# Altium integrated library Self made library.IntLib: 370 symbols (part 1 of 3)
Pins are listed as number, name and electrical type; pins without a type are passive.

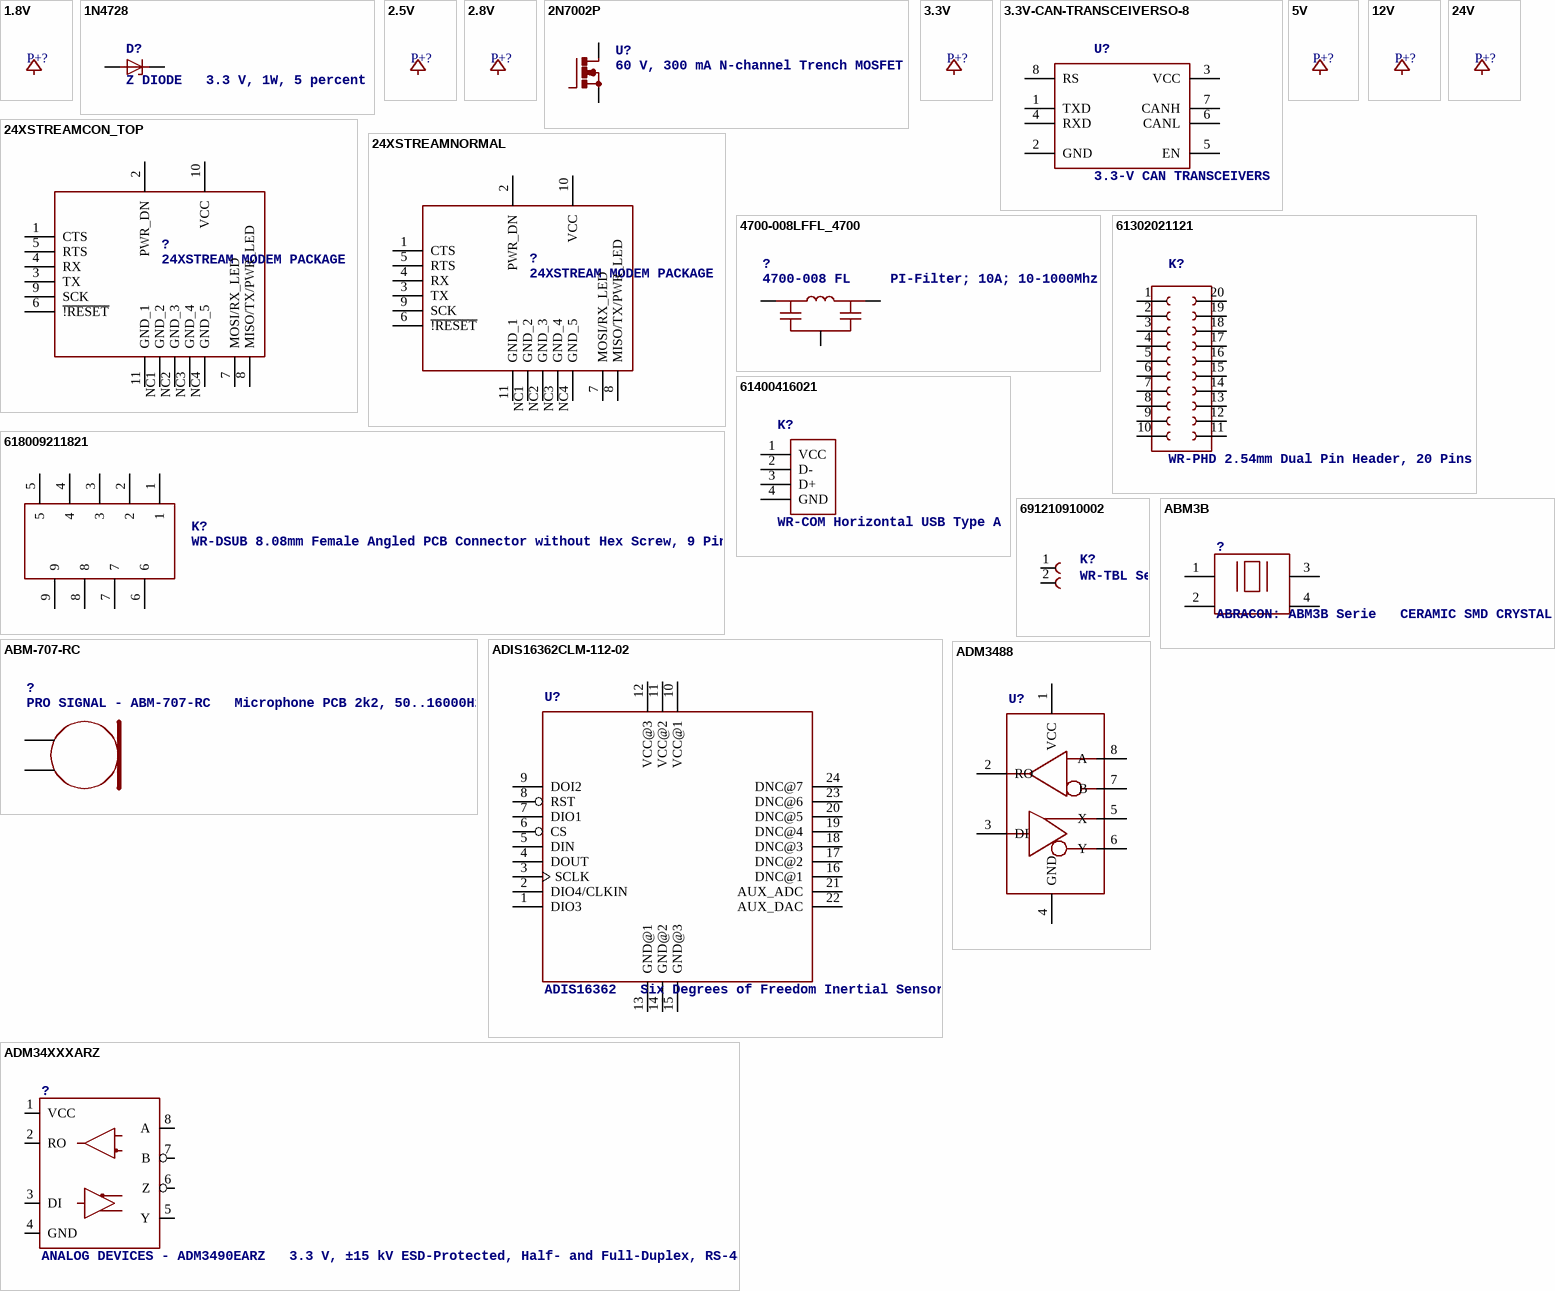
[diagram p0: symbols 1.8V to ADM3488]

## 1.8V
designator P+?
pins: ?1 1.8V (oe)

## 1N4728
designator D?, comment Z DIODE   3.3 V, 1W, 5 percent
footprint DO41Z10
pins: A, C

## 2.5V
designator P+?
pins: ?1 2.5V (oe)

## 2.8V
designator P+?
pins: ?1 2.8V (oe)

## 2N7002P
designator U?, comment 60 V, 300 mA N-channel Trench MOSFET
MANUFACTURER: NXP Semiconductors; MANUFACTURER_PART_NUMBER: 2N7002,215; UNIT_PRICE: 0.147; SUPPLIER: mouser; SUPPLIER_PART_NUMBER: 771-2N7002-T/R
footprint TO236
pins: 1 G, 2 S, 3 D

## 3.3V
designator P+?
pins: ?1 3.3V (oe)

## 3.3V-CAN-TRANSCEIVERSO-8
designator U?, comment 3.3-V CAN TRANSCEIVERS
footprint SO-8
pins: 1 TXD, 2 GND, 3 VCC, 4 RXD, 5 EN, 6 CANL, 7 CANH, 8 RS

## 5V
designator P+?
pins: ?1 5V (oe)

## 12V
designator P+?
pins: ?1 12V (oe)

## 24V
designator P+?
pins: ?1 24V (oe)

## 24XSTREAMCON_TOP
designator ?, comment 24XSTREAM MODEM PACKAGE
footprint 24XSTREAM_CON_TOP_RIGHT_ANGLE
pins: 1 CTS, 2 PWR_DN, 3 TX, 4 RX, 5 RTS, 6 ~{!RESET}, 7 MOSI/RX_LED, 8 MISO/TX/PWR_LED, 9 SCK, 10 VCC (power), 11 GND_1 (power), NC1 GND_2 (power), NC2 GND_3 (power), NC3 GND_4 (power), NC4 GND_5 (power)

## 24XSTREAMNORMAL
designator ?, comment 24XSTREAM MODEM PACKAGE
footprint 24XSTREAM
pins: 1 CTS, 2 PWR_DN, 3 TX, 4 RX, 5 RTS, 6 ~{!RESET}, 7 MOSI/RX_LED, 8 MISO/TX/PWR_LED, 9 SCK, 10 VCC (power), 11 GND_1 (power), NC1 GND_2 (power), NC2 GND_3 (power), NC3 GND_4 (power), NC4 GND_5 (power)

## 4700-008LFFL_4700
designator ?, comment 4700-008 FL     PI-Filter; 10A; 10-1000Mhz
footprint FL_4700
pins: 1, 2 3, G 2

## 61302021121
designator K?, comment WR-PHD 2.54mm Dual Pin Header, 20 Pins
MANUFACTURER: Würth; MANUFACTURER_PART_NUMBER: 613 020 211 21; SUPPLIER: Würth; SUPPLIER_PART_NUMBER: 613 020 211 21
footprint 61302021121
pins: 1, 2, 3, 4, 5, 6, 7, 8, 9, 10, 11, 12, 13, 14, 15, 16, 17, 18, 19, 20

## 61400416021
designator K?, comment WR-COM Horizontal USB Type A
MANUFACTURER: Würth; MANUFACTURER_PART_NUMBER: 614 004 160 21; SUPPLIER: Würth; SUPPLIER_PART_NUMBER: 614 004 160 21
footprint 61400416021
pins: 1 VCC, 2 D-, 3 D+, 4 GND

## 618009211821
designator K?, comment WR-DSUB 8.08mm Female Angled PCB Connector without Hex Screw, 9 Pins
MANUFACTURER: Würth; MANUFACTURER_PART_NUMBER: 618 009 211 821; SUPPLIER: Würth; SUPPLIER_PART_NUMBER: 618 009 211 821
footprint 618009211821
pins: 1, 2, 3, 4, 5, 6, 7, 8, 9

## 691210910002
designator K?, comment WR-TBL Serie 2109 - 2.54mm Horizontal Entry Modular with Rising Cage Clamp - 0.8mm2 Wires, 2 Pins
MANUFACTURER: Würth; MANUFACTURER_PART_NUMBER: 691 210 910 002; SUPPLIER: Würth; SUPPLIER_PART_NUMBER: 691 210 910 002
footprint 691210910002
pins: 1, 2

## ABM3B
designator ?, comment ABRACON: ABM3B Serie   CERAMIC SMD CRYSTAL
footprint ABM3B
pins: 1, 2, 3 4, 4 3

## ABM-707-RC
designator ?, comment PRO SIGNAL - ABM-707-RC   Microphone PCB 2k2, 50..16000Hz
footprint ABM-707-RC
pins: 1, 2

## ADIS16362CLM-112-02
designator U?, comment ADIS16362   Six Degrees of Freedom Inertial Sensor
footprint SAMTEC-112-02-BE
pins: 1 DIO3, 2 DIO4/CLKIN, 3 SCLK, 4 DOUT, 5 DIN, 6 CS, 7 DIO1, 8 RST, 9 DOI2, 10 VCC@1, 11 VCC@2, 12 VCC@3, 13 GND@1, 14 GND@2, 15 GND@3, 16 DNC@1, 17 DNC@2, 18 DNC@3, 19 DNC@4, 20 DNC@5, 21 AUX_ADC, 22 AUX_DAC, 23 DNC@6, 24 DNC@7

## ADM34XXXARZ
designator ?, comment ANALOG DEVICES - ADM3490EARZ   3.3 V, ±15 kV ESD-Protected, Half- and Full-Duplex, RS-485/RS-422 Transceivers   Same footprint and same fonction but other ESD and/or speed specification (see datascheet) : ADM3488EARZ, ADM3488ARZ, ADM3490ARZ
footprint SOIC8
pins: 1 VCC, 2 RO, 3 DI, 4 GND, 5 Y, 6 Z, 7 B, 8 A

## ADM3488
designator U?
footprint AD_SOIC_8
pins: 1 VCC (power), 2 RO, 3 DI, 4 GND (power), 5 X, 6 Y, 7 B, 8 A

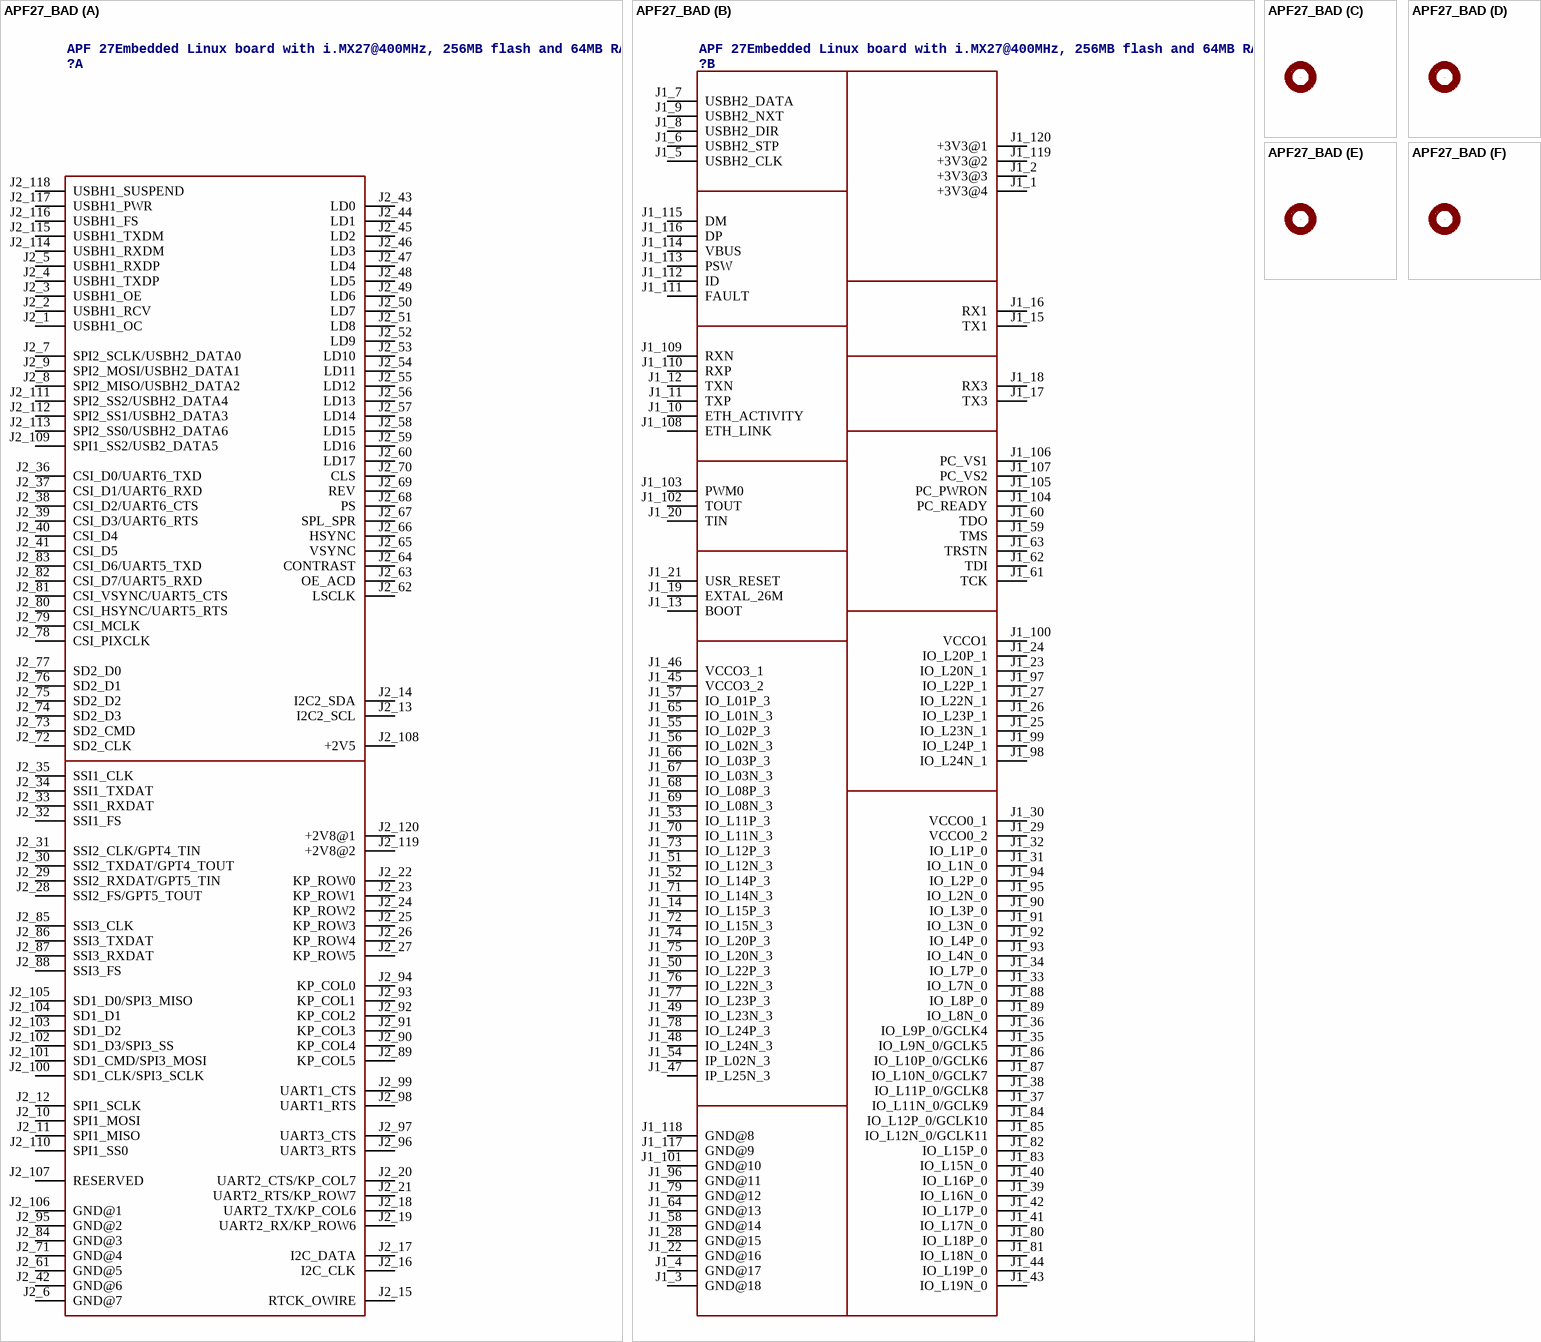
[diagram p1: symbol APF27_BAD]

## APF27_BAD
designator ?, comment APF 27Embedded Linux board with i.MX27@400MHz, 256MB flash and 64MB RAM
footprint APF27_WRONG_VERSION_DO_NOT_USE
part A pins: J2_1 USBH1_OC, J2_2 USBH1_RCV, J2_3 USBH1_OE, J2_4 USBH1_TXDP, J2_5 USBH1_RXDP, J2_6 GND@7, J2_7 SPI2_SCLK/USBH2_DATA0, J2_8 SPI2_MISO/USBH2_DATA2, J2_9 SPI2_MOSI/USBH2_DATA1, J2_10 SPI1_MOSI, J2_11 SPI1_MISO, J2_12 SPI1_SCLK, J2_13 I2C2_SCL, J2_14 I2C2_SDA, J2_15 RTCK_OWIRE, J2_16 I2C_CLK, J2_17 I2C_DATA, J2_18 UART2_TX/KP_COL6, J2_19 UART2_RX/KP_ROW6, J2_20 UART2_CTS/KP_COL7, J2_21 UART2_RTS/KP_ROW7, J2_22 KP_ROW0, J2_23 KP_ROW1, J2_24 KP_ROW2, J2_25 KP_ROW3, J2_26 KP_ROW4, J2_27 KP_ROW5, J2_28 SSI2_FS/GPT5_TOUT, J2_29 SSI2_RXDAT/GPT5_TIN, J2_30 SSI2_TXDAT/GPT4_TOUT, J2_31 SSI2_CLK/GPT4_TIN, J2_32 SSI1_FS, J2_33 SSI1_RXDAT, J2_34 SSI1_TXDAT, J2_35 SSI1_CLK, J2_36 CSI_D0/UART6_TXD, J2_37 CSI_D1/UART6_RXD, J2_38 CSI_D2/UART6_CTS, J2_39 CSI_D3/UART6_RTS, J2_40 CSI_D4, J2_41 CSI_D5, J2_42 GND@6, J2_43 LD0, J2_44 LD1, J2_45 LD2, J2_46 LD3, J2_47 LD4, J2_48 LD5, J2_49 LD6, J2_50 LD7, J2_51 LD8, J2_52 LD9, J2_53 LD10, J2_54 LD11, J2_55 LD12, J2_56 LD13, J2_57 LD14, J2_58 LD15, J2_59 LD16, J2_60 LD17, J2_61 GND@5, J2_62 LSCLK, J2_63 OE_ACD, J2_64 CONTRAST, J2_65 VSYNC, J2_66 HSYNC, J2_67 SPL_SPR, J2_68 PS, J2_69 REV, J2_70 CLS, J2_71 GND@4, J2_72 SD2_CLK, J2_73 SD2_CMD, J2_74 SD2_D3, J2_75 SD2_D2, J2_76 SD2_D1, J2_77 SD2_D0, J2_78 CSI_PIXCLK, J2_79 CSI_MCLK, J2_80 CSI_HSYNC/UART5_RTS, J2_81 CSI_VSYNC/UART5_CTS, J2_82 CSI_D7/UART5_RXD, J2_83 CSI_D6/UART5_TXD, J2_84 GND@3, J2_85 SSI3_CLK, J2_86 SSI3_TXDAT, J2_87 SSI3_RXDAT, J2_88 SSI3_FS, J2_89 KP_COL5, J2_90 KP_COL4, J2_91 KP_COL3, J2_92 KP_COL2, J2_93 KP_COL1, J2_94 KP_COL0, J2_95 GND@2, J2_96 UART3_RTS, J2_97 UART3_CTS, J2_98 UART1_RTS, J2_99 UART1_CTS, J2_100 SD1_CLK/SPI3_SCLK, J2_101 SD1_CMD/SPI3_MOSI, J2_102 SD1_D3/SPI3_SS, J2_103 SD1_D2, J2_104 SD1_D1, J2_105 SD1_D0/SPI3_MISO, J2_106 GND@1, J2_107 RESERVED, J2_108 +2V5, J2_109 SPI1_SS2/USB2_DATA5, J2_110 SPI1_SS0, J2_111 SPI2_SS2/USBH2_DATA4, J2_112 SPI2_SS1/USBH2_DATA3, J2_113 SPI2_SS0/USBH2_DATA6, J2_114 USBH1_RXDM, J2_115 USBH1_TXDM, J2_116 USBH1_FS, J2_117 USBH1_PWR, J2_118 USBH1_SUSPEND, J2_119 +2V8@2, J2_120 +2V8@1
part B pins: J1_1 +3V3@4, J1_2 +3V3@3, J1_3 GND@18, J1_4 GND@17, J1_5 USBH2_CLK, J1_6 USBH2_STP, J1_7 USBH2_DATA, J1_8 USBH2_DIR, J1_9 USBH2_NXT, J1_10 ETH_ACTIVITY, J1_11 TXP, J1_12 TXN, J1_13 BOOT, J1_14 IO_L15P_3, J1_15 TX1, J1_16 RX1, J1_17 TX3, J1_18 RX3, J1_19 EXTAL_26M, J1_20 TIN, J1_21 USR_RESET, J1_22 GND@16, J1_23 IO_L20N_1, J1_24 IO_L20P_1, J1_25 IO_L23N_1, J1_26 IO_L23P_1, J1_27 IO_L22N_1, J1_28 GND@15, J1_29 VCCO0_2, J1_30 VCCO0_1, J1_31 IO_L1N_0, J1_32 IO_L1P_0, J1_33 IO_L7N_0, J1_34 IO_L7P_0, J1_35 IO_L9N_0/GCLK5, J1_36 IO_L9P_0/GCLK4, J1_37 IO_L11N_0/GCLK9, J1_38 IO_L11P_0/GCLK8, J1_39 IO_L16N_0, J1_40 IO_L16P_0, J1_41 IO_L17N_0, J1_42 IO_L17P_0, J1_43 IO_L19N_0, J1_44 IO_L19P_0, J1_45 VCCO3_2, J1_46 VCCO3_1, J1_47 IP_L25N_3, J1_48 IO_L24N_3, J1_49 IO_L23N_3, J1_50 IO_L22P_3, J1_51 IO_L12N_3, J1_52 IO_L14P_3, J1_53 IO_L11P_3, J1_54 IP_L02N_3, J1_55 IO_L02P_3, J1_56 IO_L02N_3, J1_57 IO_L01P_3, J1_58 GND@14, J1_59 TMS, J1_60 TDO, J1_61 TCK, J1_62 TDI, J1_63 TRSTN, J1_64 GND@13, J1_65 IO_L01N_3, J1_66 IO_L03P_3, J1_67 IO_L03N_3, J1_68 IO_L08P_3, J1_69 IO_L08N_3, J1_70 IO_L11N_3, J1_71 IO_L14N_3, J1_72 IO_L15N_3, J1_73 IO_L12P_3, J1_74 IO_L20P_3, J1_75 IO_L20N_3, J1_76 IO_L22N_3, J1_77 IO_L23P_3, J1_78 IO_L24P_3, J1_79 GND@12, J1_80 IO_L18P_0, J1_81 IO_L18N_0, J1_82 IO_L15P_0, J1_83 IO_L15N_0, J1_84 IO_L12P_0/GCLK10, J1_85 IO_L12N_0/GCLK11, J1_86 IO_L10P_0/GCLK6, J1_87 IO_L10N_0/GCLK7, J1_88 IO_L8P_0, J1_89 IO_L8N_0, J1_90 IO_L3P_0, J1_91 IO_L3N_0, J1_92 IO_L4P_0, J1_93 IO_L4N_0, J1_94 IO_L2P_0, J1_95 IO_L2N_0, J1_96 GND@11, J1_97 IO_L22P_1, J1_98 IO_L24N_1, J1_99 IO_L24P_1, J1_100 VCCO1, J1_101 GND@10, J1_102 TOUT, J1_103 PWM0, J1_104 PC_READY, J1_105 PC_PWRON, J1_106 PC_VS1, J1_107 PC_VS2, J1_108 ETH_LINK, J1_109 RXN, J1_110 RXP, J1_111 FAULT, J1_112 ID, J1_113 PSW, J1_114 VBUS, J1_115 DM, J1_116 DP, J1_117 GND@9, J1_118 GND@8, J1_119 +3V3@2, J1_120 +3V3@1
part C pins: MH_1 MH
part D pins: MH_2 MH
part E pins: MH_3 MH
part F pins: MH_4 MH

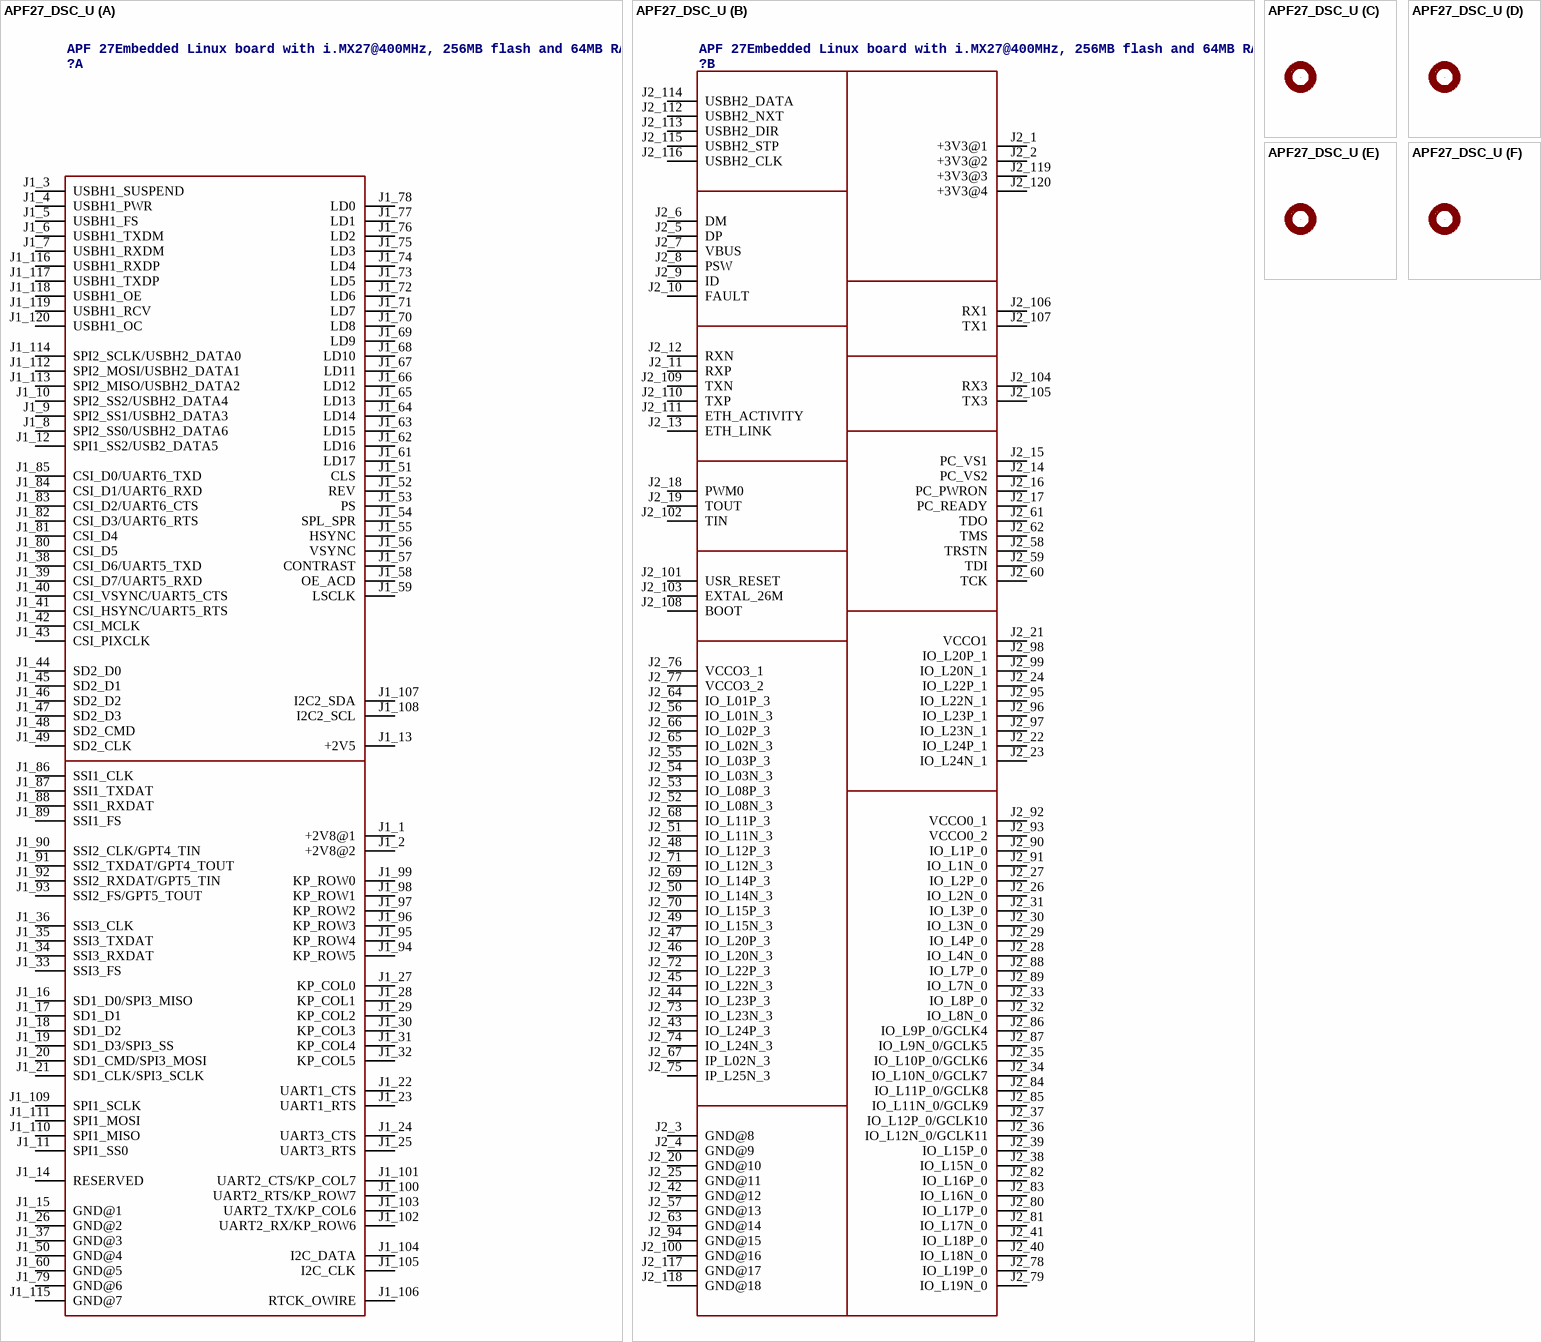
[diagram p2: symbol APF27_DSC_U]

## APF27_DSC_U
designator ?, comment APF 27Embedded Linux board with i.MX27@400MHz, 256MB flash and 64MB RAM
footprint AFP27_DESERIALIZER_UNDER_CONN
part A pins: J1_1 +2V8@1, J1_2 +2V8@2, J1_3 USBH1_SUSPEND, J1_4 USBH1_PWR, J1_5 USBH1_FS, J1_6 USBH1_TXDM, J1_7 USBH1_RXDM, J1_8 SPI2_SS0/USBH2_DATA6, J1_9 SPI2_SS1/USBH2_DATA3, J1_10 SPI2_SS2/USBH2_DATA4, J1_11 SPI1_SS0, J1_12 SPI1_SS2/USB2_DATA5, J1_13 +2V5, J1_14 RESERVED, J1_15 GND@1, J1_16 SD1_D0/SPI3_MISO, J1_17 SD1_D1, J1_18 SD1_D2, J1_19 SD1_D3/SPI3_SS, J1_20 SD1_CMD/SPI3_MOSI, J1_21 SD1_CLK/SPI3_SCLK, J1_22 UART1_CTS, J1_23 UART1_RTS, J1_24 UART3_CTS, J1_25 UART3_RTS, J1_26 GND@2, J1_27 KP_COL0, J1_28 KP_COL1, J1_29 KP_COL2, J1_30 KP_COL3, J1_31 KP_COL4, J1_32 KP_COL5, J1_33 SSI3_FS, J1_34 SSI3_RXDAT, J1_35 SSI3_TXDAT, J1_36 SSI3_CLK, J1_37 GND@3, J1_38 CSI_D6/UART5_TXD, J1_39 CSI_D7/UART5_RXD, J1_40 CSI_VSYNC/UART5_CTS, J1_41 CSI_HSYNC/UART5_RTS, J1_42 CSI_MCLK, J1_43 CSI_PIXCLK, J1_44 SD2_D0, J1_45 SD2_D1, J1_46 SD2_D2, J1_47 SD2_D3, J1_48 SD2_CMD, J1_49 SD2_CLK, J1_50 GND@4, J1_51 CLS, J1_52 REV, J1_53 PS, J1_54 SPL_SPR, J1_55 HSYNC, J1_56 VSYNC, J1_57 CONTRAST, J1_58 OE_ACD, J1_59 LSCLK, J1_60 GND@5, J1_61 LD17, J1_62 LD16, J1_63 LD15, J1_64 LD14, J1_65 LD13, J1_66 LD12, J1_67 LD11, J1_68 LD10, J1_69 LD9, J1_70 LD8, J1_71 LD7, J1_72 LD6, J1_73 LD5, J1_74 LD4, J1_75 LD3, J1_76 LD2, J1_77 LD1, J1_78 LD0, J1_79 GND@6, J1_80 CSI_D5, J1_81 CSI_D4, J1_82 CSI_D3/UART6_RTS, J1_83 CSI_D2/UART6_CTS, J1_84 CSI_D1/UART6_RXD, J1_85 CSI_D0/UART6_TXD, J1_86 SSI1_CLK, J1_87 SSI1_TXDAT, J1_88 SSI1_RXDAT, J1_89 SSI1_FS, J1_90 SSI2_CLK/GPT4_TIN, J1_91 SSI2_TXDAT/GPT4_TOUT, J1_92 SSI2_RXDAT/GPT5_TIN, J1_93 SSI2_FS/GPT5_TOUT, J1_94 KP_ROW5, J1_95 KP_ROW4, J1_96 KP_ROW3, J1_97 KP_ROW2, J1_98 KP_ROW1, J1_99 KP_ROW0, J1_100 UART2_RTS/KP_ROW7, J1_101 UART2_CTS/KP_COL7, J1_102 UART2_RX/KP_ROW6, J1_103 UART2_TX/KP_COL6, J1_104 I2C_DATA, J1_105 I2C_CLK, J1_106 RTCK_OWIRE, J1_107 I2C2_SDA, J1_108 I2C2_SCL, J1_109 SPI1_SCLK, J1_110 SPI1_MISO, J1_111 SPI1_MOSI, J1_112 SPI2_MOSI/USBH2_DATA1, J1_113 SPI2_MISO/USBH2_DATA2, J1_114 SPI2_SCLK/USBH2_DATA0, J1_115 GND@7, J1_116 USBH1_RXDP, J1_117 USBH1_TXDP, J1_118 USBH1_OE, J1_119 USBH1_RCV, J1_120 USBH1_OC
part B pins: J2_1 +3V3@1, J2_2 +3V3@2, J2_3 GND@8, J2_4 GND@9, J2_5 DP, J2_6 DM, J2_7 VBUS, J2_8 PSW, J2_9 ID, J2_10 FAULT, J2_11 RXP, J2_12 RXN, J2_13 ETH_LINK, J2_14 PC_VS2, J2_15 PC_VS1, J2_16 PC_PWRON, J2_17 PC_READY, J2_18 PWM0, J2_19 TOUT, J2_20 GND@10, J2_21 VCCO1, J2_22 IO_L24P_1, J2_23 IO_L24N_1, J2_24 IO_L22P_1, J2_25 GND@11, J2_26 IO_L2N_0, J2_27 IO_L2P_0, J2_28 IO_L4N_0, J2_29 IO_L4P_0, J2_30 IO_L3N_0, J2_31 IO_L3P_0, J2_32 IO_L8N_0, J2_33 IO_L8P_0, J2_34 IO_L10N_0/GCLK7, J2_35 IO_L10P_0/GCLK6, J2_36 IO_L12N_0/GCLK11, J2_37 IO_L12P_0/GCLK10, J2_38 IO_L15N_0, J2_39 IO_L15P_0, J2_40 IO_L18N_0, J2_41 IO_L18P_0, J2_42 GND@12, J2_43 IO_L24P_3, J2_44 IO_L23P_3, J2_45 IO_L22N_3, J2_46 IO_L20N_3, J2_47 IO_L20P_3, J2_48 IO_L12P_3, J2_49 IO_L15N_3, J2_50 IO_L14N_3, J2_51 IO_L11N_3, J2_52 IO_L08N_3, J2_53 IO_L08P_3, J2_54 IO_L03N_3, J2_55 IO_L03P_3, J2_56 IO_L01N_3, J2_57 GND@13, J2_58 TRSTN, J2_59 TDI, J2_60 TCK, J2_61 TDO, J2_62 TMS, J2_63 GND@14, J2_64 IO_L01P_3, J2_65 IO_L02N_3, J2_66 IO_L02P_3, J2_67 IP_L02N_3, J2_68 IO_L11P_3, J2_69 IO_L14P_3, J2_70 IO_L15P_3, J2_71 IO_L12N_3, J2_72 IO_L22P_3, J2_73 IO_L23N_3, J2_74 IO_L24N_3, J2_75 IP_L25N_3, J2_76 VCCO3_1, J2_77 VCCO3_2, J2_78 IO_L19P_0, J2_79 IO_L19N_0, J2_80 IO_L17P_0, J2_81 IO_L17N_0, J2_82 IO_L16P_0, J2_83 IO_L16N_0, J2_84 IO_L11P_0/GCLK8, J2_85 IO_L11N_0/GCLK9, J2_86 IO_L9P_0/GCLK4, J2_87 IO_L9N_0/GCLK5, J2_88 IO_L7P_0, J2_89 IO_L7N_0, J2_90 IO_L1P_0, J2_91 IO_L1N_0, J2_92 VCCO0_1, J2_93 VCCO0_2, J2_94 GND@15, J2_95 IO_L22N_1, J2_96 IO_L23P_1, J2_97 IO_L23N_1, J2_98 IO_L20P_1, J2_99 IO_L20N_1, J2_100 GND@16, J2_101 USR_RESET, J2_102 TIN, J2_103 EXTAL_26M, J2_104 RX3, J2_105 TX3, J2_106 RX1, J2_107 TX1, J2_108 BOOT, J2_109 TXN, J2_110 TXP, J2_111 ETH_ACTIVITY, J2_112 USBH2_NXT, J2_113 USBH2_DIR, J2_114 USBH2_DATA, J2_115 USBH2_STP, J2_116 USBH2_CLK, J2_117 GND@17, J2_118 GND@18, J2_119 +3V3@3, J2_120 +3V3@4
part C pins: MH_1 MH
part D pins: MH_2 MH
part E pins: MH_3 MH
part F pins: MH_4 MH

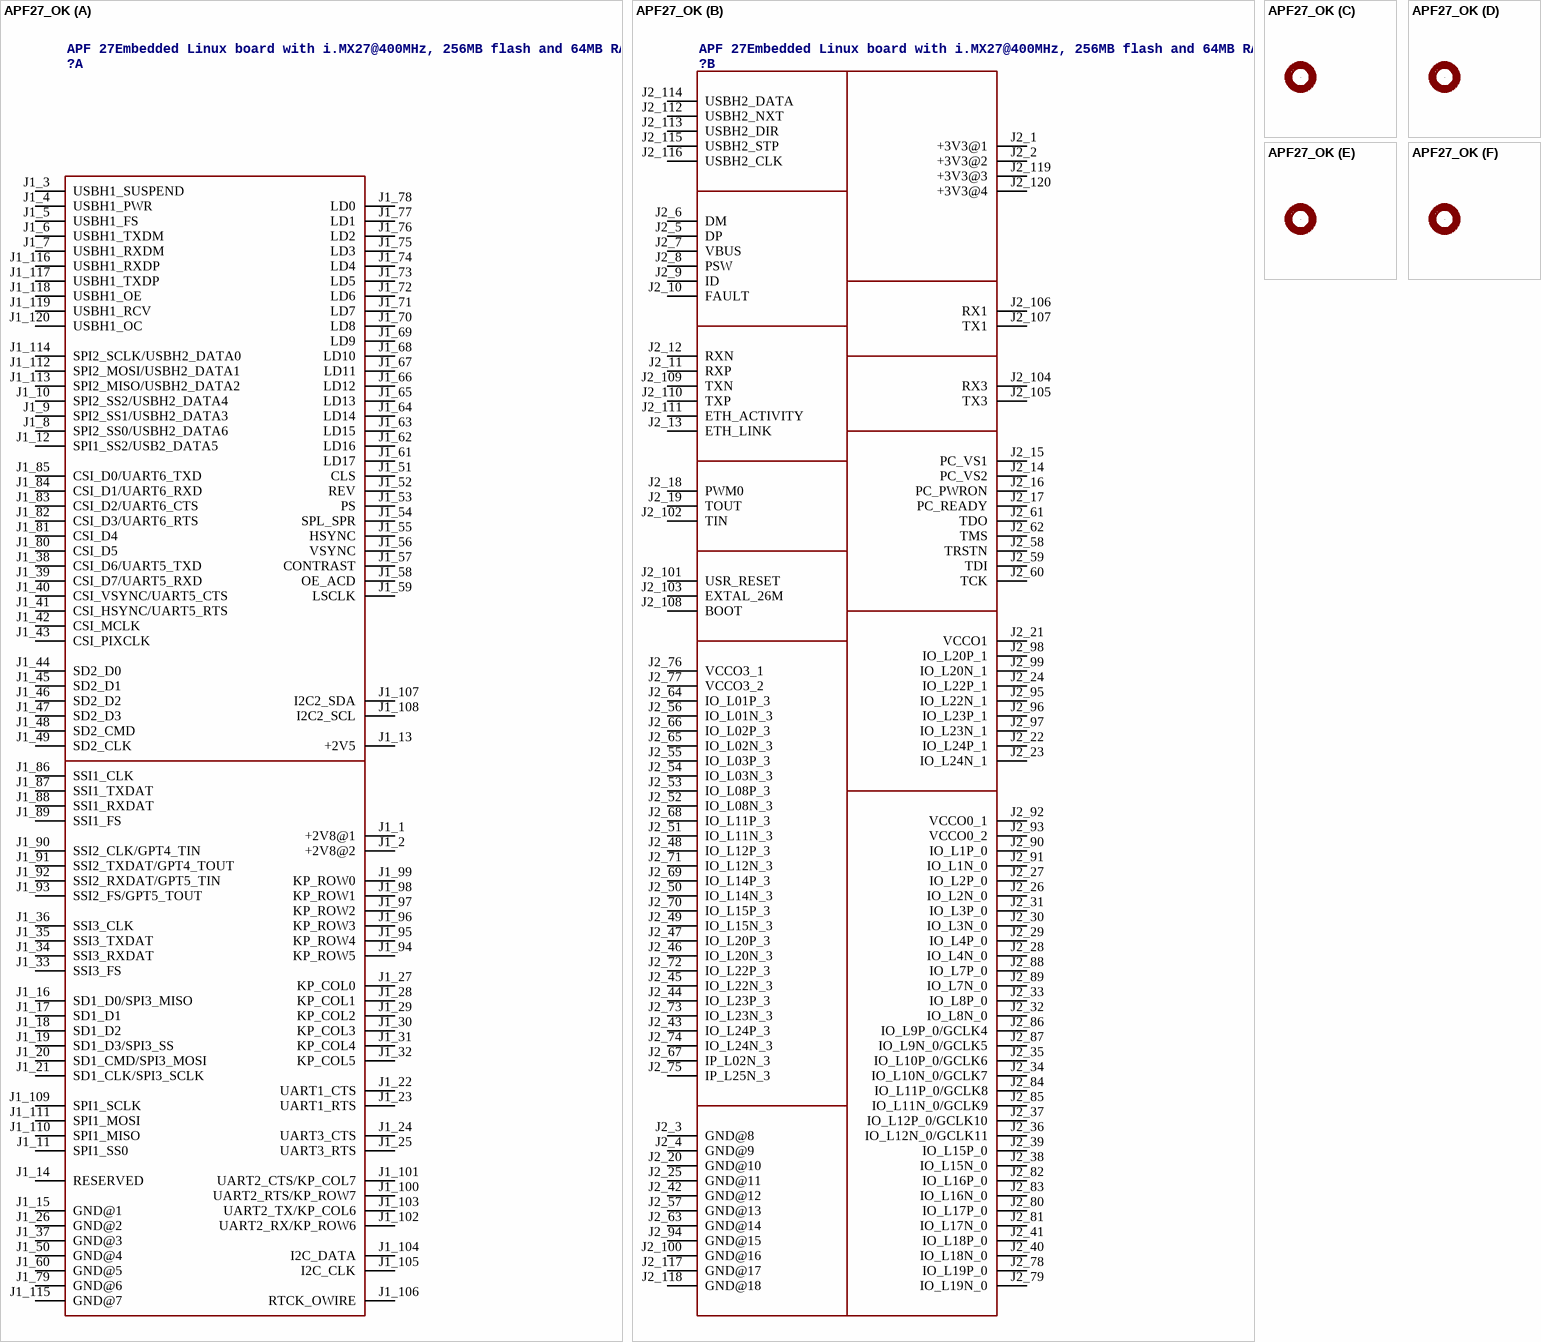
[diagram p3: symbol APF27_OK]

## APF27_OK
designator ?, comment APF 27Embedded Linux board with i.MX27@400MHz, 256MB flash and 64MB RAM
MANUFACTURER: Armadeus; MANUFACTURER_PART_NUMBER: APF27-M64F256-EU; UNIT_PRICE: 103; SUPPLIER: Armadeus; SUPPLIER_PART_NUMBER: APF27-M64F256-EU
footprint APF27
part A pins: J1_1 +2V8@1, J1_2 +2V8@2, J1_3 USBH1_SUSPEND, J1_4 USBH1_PWR, J1_5 USBH1_FS, J1_6 USBH1_TXDM, J1_7 USBH1_RXDM, J1_8 SPI2_SS0/USBH2_DATA6, J1_9 SPI2_SS1/USBH2_DATA3, J1_10 SPI2_SS2/USBH2_DATA4, J1_11 SPI1_SS0, J1_12 SPI1_SS2/USB2_DATA5, J1_13 +2V5, J1_14 RESERVED, J1_15 GND@1, J1_16 SD1_D0/SPI3_MISO, J1_17 SD1_D1, J1_18 SD1_D2, J1_19 SD1_D3/SPI3_SS, J1_20 SD1_CMD/SPI3_MOSI, J1_21 SD1_CLK/SPI3_SCLK, J1_22 UART1_CTS, J1_23 UART1_RTS, J1_24 UART3_CTS, J1_25 UART3_RTS, J1_26 GND@2, J1_27 KP_COL0, J1_28 KP_COL1, J1_29 KP_COL2, J1_30 KP_COL3, J1_31 KP_COL4, J1_32 KP_COL5, J1_33 SSI3_FS, J1_34 SSI3_RXDAT, J1_35 SSI3_TXDAT, J1_36 SSI3_CLK, J1_37 GND@3, J1_38 CSI_D6/UART5_TXD, J1_39 CSI_D7/UART5_RXD, J1_40 CSI_VSYNC/UART5_CTS, J1_41 CSI_HSYNC/UART5_RTS, J1_42 CSI_MCLK, J1_43 CSI_PIXCLK, J1_44 SD2_D0, J1_45 SD2_D1, J1_46 SD2_D2, J1_47 SD2_D3, J1_48 SD2_CMD, J1_49 SD2_CLK, J1_50 GND@4, J1_51 CLS, J1_52 REV, J1_53 PS, J1_54 SPL_SPR, J1_55 HSYNC, J1_56 VSYNC, J1_57 CONTRAST, J1_58 OE_ACD, J1_59 LSCLK, J1_60 GND@5, J1_61 LD17, J1_62 LD16, J1_63 LD15, J1_64 LD14, J1_65 LD13, J1_66 LD12, J1_67 LD11, J1_68 LD10, J1_69 LD9, J1_70 LD8, J1_71 LD7, J1_72 LD6, J1_73 LD5, J1_74 LD4, J1_75 LD3, J1_76 LD2, J1_77 LD1, J1_78 LD0, J1_79 GND@6, J1_80 CSI_D5, J1_81 CSI_D4, J1_82 CSI_D3/UART6_RTS, J1_83 CSI_D2/UART6_CTS, J1_84 CSI_D1/UART6_RXD, J1_85 CSI_D0/UART6_TXD, J1_86 SSI1_CLK, J1_87 SSI1_TXDAT, J1_88 SSI1_RXDAT, J1_89 SSI1_FS, J1_90 SSI2_CLK/GPT4_TIN, J1_91 SSI2_TXDAT/GPT4_TOUT, J1_92 SSI2_RXDAT/GPT5_TIN, J1_93 SSI2_FS/GPT5_TOUT, J1_94 KP_ROW5, J1_95 KP_ROW4, J1_96 KP_ROW3, J1_97 KP_ROW2, J1_98 KP_ROW1, J1_99 KP_ROW0, J1_100 UART2_RTS/KP_ROW7, J1_101 UART2_CTS/KP_COL7, J1_102 UART2_RX/KP_ROW6, J1_103 UART2_TX/KP_COL6, J1_104 I2C_DATA, J1_105 I2C_CLK, J1_106 RTCK_OWIRE, J1_107 I2C2_SDA, J1_108 I2C2_SCL, J1_109 SPI1_SCLK, J1_110 SPI1_MISO, J1_111 SPI1_MOSI, J1_112 SPI2_MOSI/USBH2_DATA1, J1_113 SPI2_MISO/USBH2_DATA2, J1_114 SPI2_SCLK/USBH2_DATA0, J1_115 GND@7, J1_116 USBH1_RXDP, J1_117 USBH1_TXDP, J1_118 USBH1_OE, J1_119 USBH1_RCV, J1_120 USBH1_OC
part B pins: J2_1 +3V3@1, J2_2 +3V3@2, J2_3 GND@8, J2_4 GND@9, J2_5 DP, J2_6 DM, J2_7 VBUS, J2_8 PSW, J2_9 ID, J2_10 FAULT, J2_11 RXP, J2_12 RXN, J2_13 ETH_LINK, J2_14 PC_VS2, J2_15 PC_VS1, J2_16 PC_PWRON, J2_17 PC_READY, J2_18 PWM0, J2_19 TOUT, J2_20 GND@10, J2_21 VCCO1, J2_22 IO_L24P_1, J2_23 IO_L24N_1, J2_24 IO_L22P_1, J2_25 GND@11, J2_26 IO_L2N_0, J2_27 IO_L2P_0, J2_28 IO_L4N_0, J2_29 IO_L4P_0, J2_30 IO_L3N_0, J2_31 IO_L3P_0, J2_32 IO_L8N_0, J2_33 IO_L8P_0, J2_34 IO_L10N_0/GCLK7, J2_35 IO_L10P_0/GCLK6, J2_36 IO_L12N_0/GCLK11, J2_37 IO_L12P_0/GCLK10, J2_38 IO_L15N_0, J2_39 IO_L15P_0, J2_40 IO_L18N_0, J2_41 IO_L18P_0, J2_42 GND@12, J2_43 IO_L24P_3, J2_44 IO_L23P_3, J2_45 IO_L22N_3, J2_46 IO_L20N_3, J2_47 IO_L20P_3, J2_48 IO_L12P_3, J2_49 IO_L15N_3, J2_50 IO_L14N_3, J2_51 IO_L11N_3, J2_52 IO_L08N_3, J2_53 IO_L08P_3, J2_54 IO_L03N_3, J2_55 IO_L03P_3, J2_56 IO_L01N_3, J2_57 GND@13, J2_58 TRSTN, J2_59 TDI, J2_60 TCK, J2_61 TDO, J2_62 TMS, J2_63 GND@14, J2_64 IO_L01P_3, J2_65 IO_L02N_3, J2_66 IO_L02P_3, J2_67 IP_L02N_3, J2_68 IO_L11P_3, J2_69 IO_L14P_3, J2_70 IO_L15P_3, J2_71 IO_L12N_3, J2_72 IO_L22P_3, J2_73 IO_L23N_3, J2_74 IO_L24N_3, J2_75 IP_L25N_3, J2_76 VCCO3_1, J2_77 VCCO3_2, J2_78 IO_L19P_0, J2_79 IO_L19N_0, J2_80 IO_L17P_0, J2_81 IO_L17N_0, J2_82 IO_L16P_0, J2_83 IO_L16N_0, J2_84 IO_L11P_0/GCLK8, J2_85 IO_L11N_0/GCLK9, J2_86 IO_L9P_0/GCLK4, J2_87 IO_L9N_0/GCLK5, J2_88 IO_L7P_0, J2_89 IO_L7N_0, J2_90 IO_L1P_0, J2_91 IO_L1N_0, J2_92 VCCO0_1, J2_93 VCCO0_2, J2_94 GND@15, J2_95 IO_L22N_1, J2_96 IO_L23P_1, J2_97 IO_L23N_1, J2_98 IO_L20P_1, J2_99 IO_L20N_1, J2_100 GND@16, J2_101 USR_RESET, J2_102 TIN, J2_103 EXTAL_26M, J2_104 RX3, J2_105 TX3, J2_106 RX1, J2_107 TX1, J2_108 BOOT, J2_109 TXN, J2_110 TXP, J2_111 ETH_ACTIVITY, J2_112 USBH2_NXT, J2_113 USBH2_DIR, J2_114 USBH2_DATA, J2_115 USBH2_STP, J2_116 USBH2_CLK, J2_117 GND@17, J2_118 GND@18, J2_119 +3V3@3, J2_120 +3V3@4